# Altium schematic symbol library MCU_Microchip_ATmega.SchLib: 440 symbols (part 3 of 7) (continued)
## ATmega329PA-A (continued)

## ATmega329PA-M
designator *  value ATmega329PA-M  Reference: U
ki_keywords: AVR 8bit Microcontroller MegaAVR LCD PicoPower; ki_description: 20MHz, 32kB Flash, 2kB SRAM, 1kB EEPROM, QFN-64; ki_fp_filters: QFN*1EP*9x9mm*P0.5mm*; Footprint: Package_DFN_QFN:QFN-64-1EP_9x9mm_P0.5mm_EP5.4x5.4mm; Datasheet: http://ww1.microchip.com/downloads/en/DeviceDoc/atmel-8284-8-bit-avr-microcontroller-atmega169a_pa_329a_pa_3290a_pa_649a_p_6490a_p_datasheet.pdf
pins: 1 LCDCAP, 2 PE0, 3 PE1, 4 PE2, 5 PE3, 6 PE4, 7 PE5, 8 PE6, 9 PE7, 10 PB0, 11 PB1, 12 PB2, 13 PB3, 14 PB4, 15 PB5, 16 PB6, 17 PB7, 18 PG3, 19 PG4, 20 PG5/~{{RESET}}, 21 VCC, 22 GND, 23 XTAL2, 24 XTAL1, 25 PD0, 26 PD1, 27 PD2, 28 PD3, 29 PD4, 30 PD5, 31 PD6, 32 PD7, 33 PG0, 34 PG1, 35 PC0, 36 PC1, 37 PC2, 38 PC3, 39 PC4, 40 PC5, 41 PC6, 42 PC7, 43 PG2, 44 PA7, 45 PA6, 46 PA5, 47 PA4, 48 PA3, 49 PA2, 50 PA1, 51 PA0, 52 VCC hidden, 53 GND hidden, 54 PF7, 55 PF6, 56 PF5, 57 PF4, 58 PF3, 59 PF2, 60 PF1, 61 PF0, 62 AREF, 63 GND hidden, 64 AVCC, 65 GND hidden

## ATmega329PV-10A
designator *  value ATmega329PV-10A  Reference: U
ki_keywords: AVR 8bit Microcontroller MegaAVR; ki_description: 10MHz, 32kB Flash, 2kB SRAM, 1kB EEPROM, JTAG, TQFP-64; ki_fp_filters: TQFP*14x14mm*P0.8mm*; Footprint: Package_QFP:TQFP-64_14x14mm_P0.8mm; Datasheet: http://ww1.microchip.com/downloads/en/DeviceDoc/Atmel-8021-AVR-ATmega329P-3290P_Datasheet.pdf
pins: 1 LCDCAP, 2 PE0, 3 PE1, 4 PE2, 5 PE3, 6 PE4, 7 PE5, 8 PE6, 9 PE7, 10 PB0, 11 PB1, 12 PB2, 13 PB3, 14 PB4, 15 PB5, 16 PB6, 17 PB7, 18 PG3, 19 PG4, 20 PG5/~{{RESET}}, 21 VCC, 22 GND, 23 XTAL2, 24 XTAL1, 25 PD0, 26 PD1, 27 PD2, 28 PD3, 29 PD4, 30 PD5, 31 PD6, 32 PD7, 33 PG0, 34 PG1, 35 PC0, 36 PC1, 37 PC2, 38 PC3, 39 PC4, 40 PC5, 41 PC6, 42 PC7, 43 PG2, 44 PA7, 45 PA6, 46 PA5, 47 PA4, 48 PA3, 49 PA2, 50 PA1, 51 PA0, 52 VCC hidden, 53 GND hidden, 54 PF7, 55 PF6, 56 PF5, 57 PF4, 58 PF3, 59 PF2, 60 PF1, 61 PF0, 62 AREF, 63 GND hidden, 64 AVCC

## ATmega329PV-10M
designator *  value ATmega329PV-10M  Reference: U
ki_keywords: AVR 8bit Microcontroller MegaAVR; ki_description: 10MHz, 32kB Flash, 2kB SRAM, 1kB EEPROM, JTAG, QFN-64; ki_fp_filters: QFN*1EP*9x9mm*P0.5mm*; Footprint: Package_DFN_QFN:QFN-64-1EP_9x9mm_P0.5mm_EP5.4x5.4mm; Datasheet: http://ww1.microchip.com/downloads/en/DeviceDoc/Atmel-8021-AVR-ATmega329P-3290P_Datasheet.pdf
pins: 1 LCDCAP, 2 PE0, 3 PE1, 4 PE2, 5 PE3, 6 PE4, 7 PE5, 8 PE6, 9 PE7, 10 PB0, 11 PB1, 12 PB2, 13 PB3, 14 PB4, 15 PB5, 16 PB6, 17 PB7, 18 PG3, 19 PG4, 20 PG5/~{{RESET}}, 21 VCC, 22 GND, 23 XTAL2, 24 XTAL1, 25 PD0, 26 PD1, 27 PD2, 28 PD3, 29 PD4, 30 PD5, 31 PD6, 32 PD7, 33 PG0, 34 PG1, 35 PC0, 36 PC1, 37 PC2, 38 PC3, 39 PC4, 40 PC5, 41 PC6, 42 PC7, 43 PG2, 44 PA7, 45 PA6, 46 PA5, 47 PA4, 48 PA3, 49 PA2, 50 PA1, 51 PA0, 52 VCC hidden, 53 GND hidden, 54 PF7, 55 PF6, 56 PF5, 57 PF4, 58 PF3, 59 PF2, 60 PF1, 61 PF0, 62 AREF, 63 GND hidden, 64 AVCC, 65 GND hidden

## ATmega329V-8A
designator *  value ATmega329V-8A  Reference: U
ki_keywords: AVR 8bit Microcontroller MegaAVR; ki_description: 8MHz, 32kB Flash, 2kB SRAM, 1kB EEPROM, JTAG, TQFP-64; ki_fp_filters: TQFP*14x14mm*P0.8mm*; Footprint: Package_QFP:TQFP-64_14x14mm_P0.8mm; Datasheet: http://ww1.microchip.com/downloads/en/DeviceDoc/doc2552.pdf
pins: 1 LCDCAP, 2 PE0, 3 PE1, 4 PE2, 5 PE3, 6 PE4, 7 PE5, 8 PE6, 9 PE7, 10 PB0, 11 PB1, 12 PB2, 13 PB3, 14 PB4, 15 PB5, 16 PB6, 17 PB7, 18 PG3, 19 PG4, 20 PG5/~{{RESET}}, 21 VCC, 22 GND, 23 XTAL2, 24 XTAL1, 25 PD0, 26 PD1, 27 PD2, 28 PD3, 29 PD4, 30 PD5, 31 PD6, 32 PD7, 33 PG0, 34 PG1, 35 PC0, 36 PC1, 37 PC2, 38 PC3, 39 PC4, 40 PC5, 41 PC6, 42 PC7, 43 PG2, 44 PA7, 45 PA6, 46 PA5, 47 PA4, 48 PA3, 49 PA2, 50 PA1, 51 PA0, 52 VCC hidden, 53 GND hidden, 54 PF7, 55 PF6, 56 PF5, 57 PF4, 58 PF3, 59 PF2, 60 PF1, 61 PF0, 62 AREF, 63 GND hidden, 64 AVCC

## ATmega329V-8M
designator *  value ATmega329V-8M  Reference: U
ki_keywords: AVR 8bit Microcontroller MegaAVR; ki_description: 8MHz, 32kB Flash, 2kB SRAM, 1kB EEPROM, JTAG, QFN-64; ki_fp_filters: QFN*1EP*9x9mm*P0.5mm*; Footprint: Package_DFN_QFN:QFN-64-1EP_9x9mm_P0.5mm_EP5.4x5.4mm; Datasheet: http://ww1.microchip.com/downloads/en/DeviceDoc/doc2552.pdf
pins: 1 LCDCAP, 2 PE0, 3 PE1, 4 PE2, 5 PE3, 6 PE4, 7 PE5, 8 PE6, 9 PE7, 10 PB0, 11 PB1, 12 PB2, 13 PB3, 14 PB4, 15 PB5, 16 PB6, 17 PB7, 18 PG3, 19 PG4, 20 PG5/~{{RESET}}, 21 VCC, 22 GND, 23 XTAL2, 24 XTAL1, 25 PD0, 26 PD1, 27 PD2, 28 PD3, 29 PD4, 30 PD5, 31 PD6, 32 PD7, 33 PG0, 34 PG1, 35 PC0, 36 PC1, 37 PC2, 38 PC3, 39 PC4, 40 PC5, 41 PC6, 42 PC7, 43 PG2, 44 PA7, 45 PA6, 46 PA5, 47 PA4, 48 PA3, 49 PA2, 50 PA1, 51 PA0, 52 VCC hidden, 53 GND hidden, 54 PF7, 55 PF6, 56 PF5, 57 PF4, 58 PF3, 59 PF2, 60 PF1, 61 PF0, 62 AREF, 63 GND hidden, 64 AVCC, 65 GND hidden

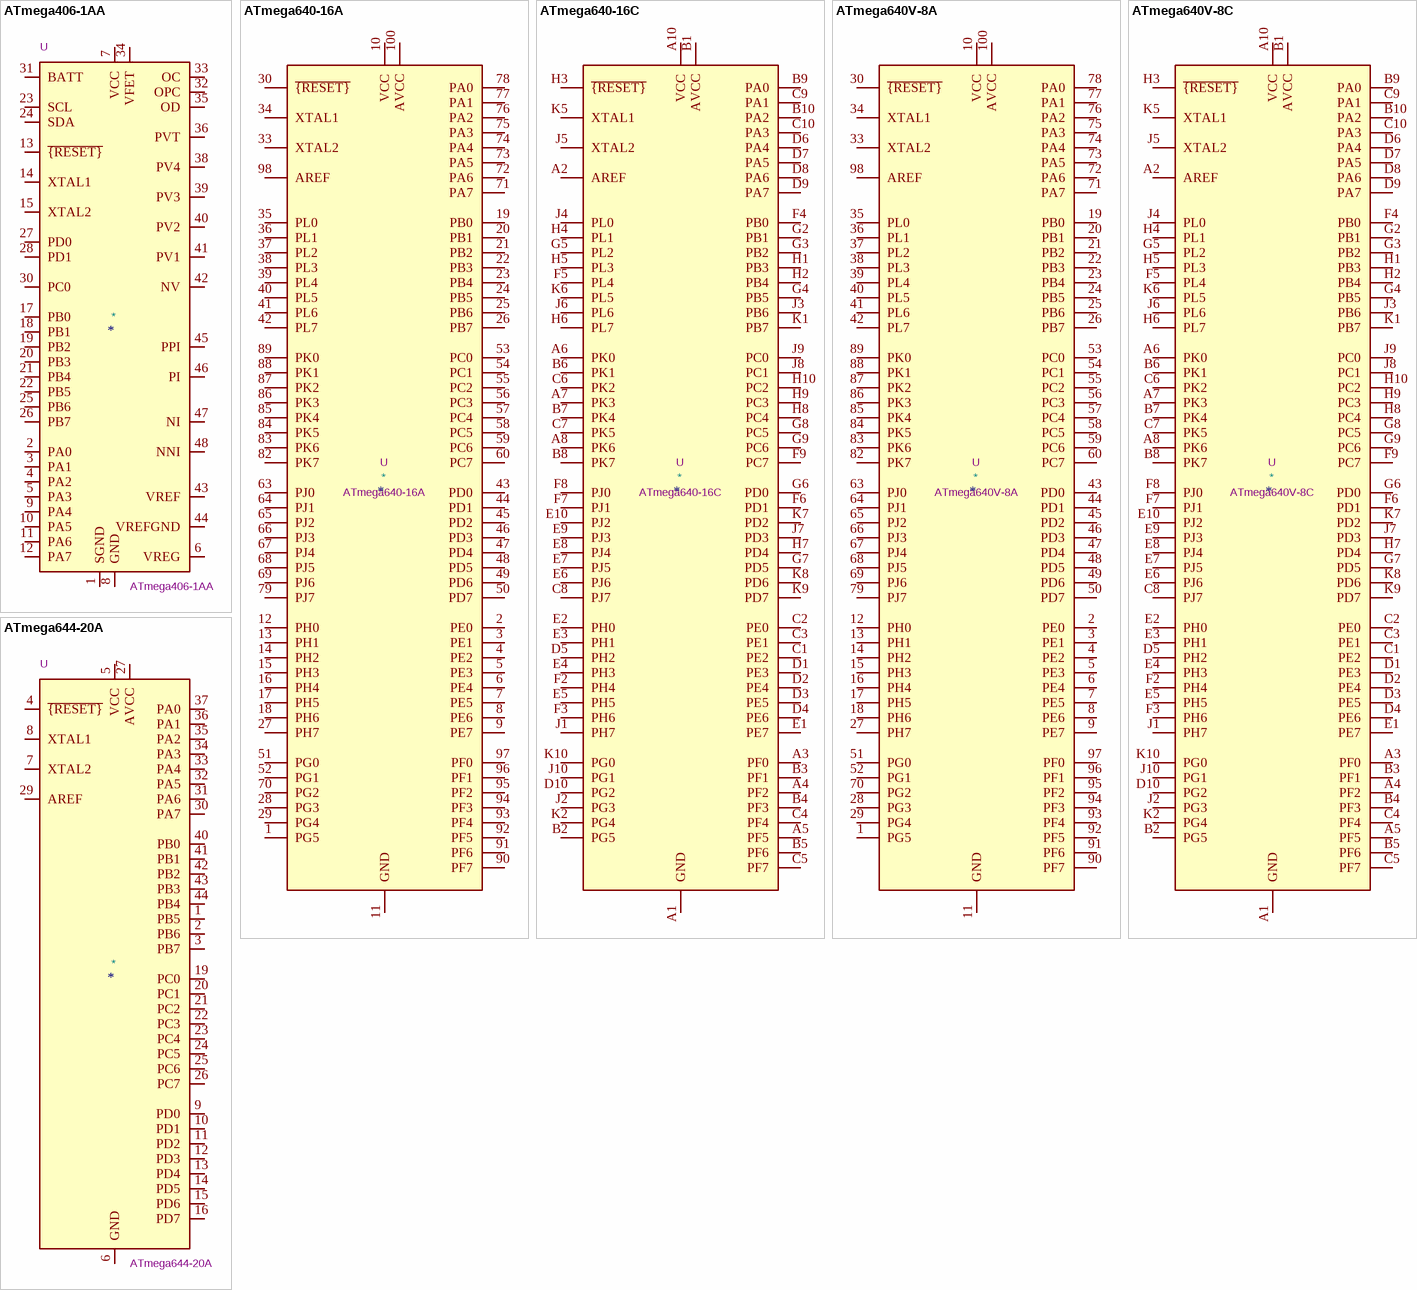
[diagram p18: symbols ATmega406-1AA to ATmega644-20A]

## ATmega406-1AA
designator *  value ATmega406-1AA  Reference: U
ki_keywords: AVR 8bit Microcontroller MegaAVR battery management; ki_description: 1MHz, 40kB Flash, 2kB SRAM, 512B EEPROM, JTAG, LQFP-48; ki_fp_filters: LQFP*7x7mm*P0.5mm*; Footprint: Package_QFP:LQFP-48_7x7mm_P0.5mm; Datasheet: http://ww1.microchip.com/downloads/en/DeviceDoc/Atmel-2548-8-bit-AVR-Microcontroller-Battery-Management-ATmega406_Datasheet.pdf
pins: 1 SGND, 2 PA0, 3 PA1, 4 PA2, 5 PA3, 6 VREG, 7 VCC, 8 GND, 9 PA4, 10 PA5, 11 PA6, 12 PA7, 13 ~{{RESET}}, 14 XTAL1, 15 XTAL2, 16 GND hidden, 17 PB0, 18 PB1, 19 PB2, 20 PB3, 21 PB4, 22 PB5, 23 SCL, 24 SDA, 25 PB6, 26 PB7, 27 PD0, 28 PD1, 29 GND hidden, 30 PC0, 31 BATT, 32 OPC, 33 OC, 34 VFET, 35 OD, 36 PVT, 37 GND hidden, 38 PV4, 39 PV3, 40 PV2, 41 PV1, 42 NV, 43 VREF, 44 VREFGND, 45 PPI, 46 PI, 47 NI, 48 NNI

## ATmega640-16A
designator *  value ATmega640-16A  Reference: U
ki_keywords: AVR 8bit Microcontroller MegaAVR; ki_description: 16MHz, 64kB Flash, 8kB SRAM, 4kB EEPROM, JTAG, TQFP-100; ki_fp_filters: TQFP*14x14mm*P0.5mm*; Footprint: Package_QFP:TQFP-100_14x14mm_P0.5mm; Datasheet: http://ww1.microchip.com/downloads/en/DeviceDoc/Atmel-2549-8-bit-AVR-Microcontroller-ATmega640-1280-1281-2560-2561_datasheet.pdf
pins: 1 PG5, 2 PE0, 3 PE1, 4 PE2, 5 PE3, 6 PE4, 7 PE5, 8 PE6, 9 PE7, 10 VCC, 11 GND, 12 PH0, 13 PH1, 14 PH2, 15 PH3, 16 PH4, 17 PH5, 18 PH6, 19 PB0, 20 PB1, 21 PB2, 22 PB3, 23 PB4, 24 PB5, 25 PB6, 26 PB7, 27 PH7, 28 PG3, 29 PG4, 30 ~{{RESET}}, 31 VCC hidden, 32 GND hidden, 33 XTAL2, 34 XTAL1, 35 PL0, 36 PL1, 37 PL2, 38 PL3, 39 PL4, 40 PL5, 41 PL6, 42 PL7, 43 PD0, 44 PD1, 45 PD2, 46 PD3, 47 PD4, 48 PD5, 49 PD6, 50 PD7, 51 PG0, 52 PG1, 53 PC0, 54 PC1, 55 PC2, 56 PC3, 57 PC4, 58 PC5, 59 PC6, 60 PC7, 61 VCC hidden, 62 GND hidden, 63 PJ0, 64 PJ1, 65 PJ2, 66 PJ3, 67 PJ4, 68 PJ5, 69 PJ6, 70 PG2, 71 PA7, 72 PA6, 73 PA5, 74 PA4, 75 PA3, 76 PA2, 77 PA1, 78 PA0, 79 PJ7, 80 VCC hidden, 81 GND hidden, 82 PK7, 83 PK6, 84 PK5, 85 PK4, 86 PK3, 87 PK2, 88 PK1, 89 PK0, 90 PF7, 91 PF6, 92 PF5, 93 PF4, 94 PF3, 95 PF2, 96 PF1, 97 PF0, 98 AREF, 99 GND hidden, 100 AVCC

## ATmega640-16C
designator *  value ATmega640-16C  Reference: U
ki_keywords: AVR 8bit Microcontroller MegaAVR; ki_description: 16MHz, 64kB Flash, 8kB SRAM, 4kB EEPROM, JTAG, TFBGA-100; ki_fp_filters: TFBGA*9.0x9.0mm*Layout10x10*P0.8mm*; Footprint: Package_BGA:TFBGA-100_9.0x9.0mm_Layout10x10_P0.8mm; Datasheet: http://ww1.microchip.com/downloads/en/DeviceDoc/Atmel-2549-8-bit-AVR-Microcontroller-ATmega640-1280-1281-2560-2561_datasheet.pdf
pins: A1 GND, A2 AREF, A3 PF0, A4 PF2, A5 PF5, A6 PK0, A7 PK3, A8 PK6, A9 GND hidden, A10 VCC, B1 AVCC, B2 PG5, B3 PF1, B4 PF3, B5 PF6, B6 PK1, B7 PK4, B8 PK7, B9 PA0, B10 PA2, C1 PE2, C2 PE0, C3 PE1, C4 PF4, C5 PF7, C6 PK2, C7 PK5, C8 PJ7, C9 PA1, C10 PA3, D1 PE3, D2 PE4, D3 PE5, D4 PE6, D5 PH2, D6 PA4, D7 PA5, D8 PA6, D9 PA7, D10 PG2, E1 PE7, E2 PH0, E3 PH1, E4 PH3, E5 PH5, E6 PJ6, E7 PJ5, E8 PJ4, E9 PJ3, E10 PJ2, F1 VCC hidden, F2 PH4, F3 PH6, F4 PB0, F5 PL4, F6 PD1, F7 PJ1, F8 PJ0, F9 PC7, F10 GND hidden, G1 GND hidden, G2 PB1, G3 PB2, G4 PB5, G5 PL2, G6 PD0, G7 PD5, G8 PC5, G9 PC6, G10 VCC hidden, H1 PB3, H2 PB4, H3 ~{{RESET}}, H4 PL1, H5 PL3, H6 PL7, H7 PD4, H8 PC4, H9 PC3, H10 PC2, J1 PH7, J2 PG3, J3 PB6, J4 PL0, J5 XTAL2, J6 PL6, J7 PD3, J8 PC1, J9 PC0, J10 PG1, K1 PB7, K2 PG4, K3 VCC hidden, K4 GND hidden, K5 XTAL1, K6 PL5, K7 PD2, K8 PD6, K9 PD7, K10 PG0

## ATmega640V-8A
designator *  value ATmega640V-8A  Reference: U
ki_keywords: AVR 8bit Microcontroller MegaAVR; ki_description: 8MHz, 64kB Flash, 8kB SRAM, 4kB EEPROM, JTAG, TQFP-100; ki_fp_filters: TQFP*14x14mm*P0.5mm*; Footprint: Package_QFP:TQFP-100_14x14mm_P0.5mm; Datasheet: http://ww1.microchip.com/downloads/en/DeviceDoc/Atmel-2549-8-bit-AVR-Microcontroller-ATmega640-1280-1281-2560-2561_datasheet.pdf
pins: 1 PG5, 2 PE0, 3 PE1, 4 PE2, 5 PE3, 6 PE4, 7 PE5, 8 PE6, 9 PE7, 10 VCC, 11 GND, 12 PH0, 13 PH1, 14 PH2, 15 PH3, 16 PH4, 17 PH5, 18 PH6, 19 PB0, 20 PB1, 21 PB2, 22 PB3, 23 PB4, 24 PB5, 25 PB6, 26 PB7, 27 PH7, 28 PG3, 29 PG4, 30 ~{{RESET}}, 31 VCC hidden, 32 GND hidden, 33 XTAL2, 34 XTAL1, 35 PL0, 36 PL1, 37 PL2, 38 PL3, 39 PL4, 40 PL5, 41 PL6, 42 PL7, 43 PD0, 44 PD1, 45 PD2, 46 PD3, 47 PD4, 48 PD5, 49 PD6, 50 PD7, 51 PG0, 52 PG1, 53 PC0, 54 PC1, 55 PC2, 56 PC3, 57 PC4, 58 PC5, 59 PC6, 60 PC7, 61 VCC hidden, 62 GND hidden, 63 PJ0, 64 PJ1, 65 PJ2, 66 PJ3, 67 PJ4, 68 PJ5, 69 PJ6, 70 PG2, 71 PA7, 72 PA6, 73 PA5, 74 PA4, 75 PA3, 76 PA2, 77 PA1, 78 PA0, 79 PJ7, 80 VCC hidden, 81 GND hidden, 82 PK7, 83 PK6, 84 PK5, 85 PK4, 86 PK3, 87 PK2, 88 PK1, 89 PK0, 90 PF7, 91 PF6, 92 PF5, 93 PF4, 94 PF3, 95 PF2, 96 PF1, 97 PF0, 98 AREF, 99 GND hidden, 100 AVCC

## ATmega640V-8C
designator *  value ATmega640V-8C  Reference: U
ki_keywords: AVR 8bit Microcontroller MegaAVR; ki_description: 8MHz, 64kB Flash, 8kB SRAM, 4kB EEPROM, JTAG, TFBGA-100; ki_fp_filters: TFBGA*9.0x9.0mm*Layout10x10*P0.8mm*; Footprint: Package_BGA:TFBGA-100_9.0x9.0mm_Layout10x10_P0.8mm; Datasheet: http://ww1.microchip.com/downloads/en/DeviceDoc/Atmel-2549-8-bit-AVR-Microcontroller-ATmega640-1280-1281-2560-2561_datasheet.pdf
pins: A1 GND, A2 AREF, A3 PF0, A4 PF2, A5 PF5, A6 PK0, A7 PK3, A8 PK6, A9 GND hidden, A10 VCC, B1 AVCC, B2 PG5, B3 PF1, B4 PF3, B5 PF6, B6 PK1, B7 PK4, B8 PK7, B9 PA0, B10 PA2, C1 PE2, C2 PE0, C3 PE1, C4 PF4, C5 PF7, C6 PK2, C7 PK5, C8 PJ7, C9 PA1, C10 PA3, D1 PE3, D2 PE4, D3 PE5, D4 PE6, D5 PH2, D6 PA4, D7 PA5, D8 PA6, D9 PA7, D10 PG2, E1 PE7, E2 PH0, E3 PH1, E4 PH3, E5 PH5, E6 PJ6, E7 PJ5, E8 PJ4, E9 PJ3, E10 PJ2, F1 VCC hidden, F2 PH4, F3 PH6, F4 PB0, F5 PL4, F6 PD1, F7 PJ1, F8 PJ0, F9 PC7, F10 GND hidden, G1 GND hidden, G2 PB1, G3 PB2, G4 PB5, G5 PL2, G6 PD0, G7 PD5, G8 PC5, G9 PC6, G10 VCC hidden, H1 PB3, H2 PB4, H3 ~{{RESET}}, H4 PL1, H5 PL3, H6 PL7, H7 PD4, H8 PC4, H9 PC3, H10 PC2, J1 PH7, J2 PG3, J3 PB6, J4 PL0, J5 XTAL2, J6 PL6, J7 PD3, J8 PC1, J9 PC0, J10 PG1, K1 PB7, K2 PG4, K3 VCC hidden, K4 GND hidden, K5 XTAL1, K6 PL5, K7 PD2, K8 PD6, K9 PD7, K10 PG0

## ATmega644-20A
designator *  value ATmega644-20A  Reference: U
ki_keywords: AVR 8bit Microcontroller MegaAVR; ki_description: 20MHz, 64kB Flash, 4kB SRAM, 2kB EEPROM, JTAG, TQFP-44; ki_fp_filters: TQFP*10x10mm*P0.8mm*; Footprint: Package_QFP:TQFP-44_10x10mm_P0.8mm; Datasheet: http://ww1.microchip.com/downloads/en/DeviceDoc/doc2593.pdf
pins: 1 PB5, 2 PB6, 3 PB7, 4 ~{{RESET}}, 5 VCC, 6 GND, 7 XTAL2, 8 XTAL1, 9 PD0, 10 PD1, 11 PD2, 12 PD3, 13 PD4, 14 PD5, 15 PD6, 16 PD7, 17 VCC hidden, 18 GND hidden, 19 PC0, 20 PC1, 21 PC2, 22 PC3, 23 PC4, 24 PC5, 25 PC6, 26 PC7, 27 AVCC, 28 GND hidden, 29 AREF, 30 PA7, 31 PA6, 32 PA5, 33 PA4, 34 PA3, 35 PA2, 36 PA1, 37 PA0, 38 VCC hidden, 39 GND hidden, 40 PB0, 41 PB1, 42 PB2, 43 PB3, 44 PB4

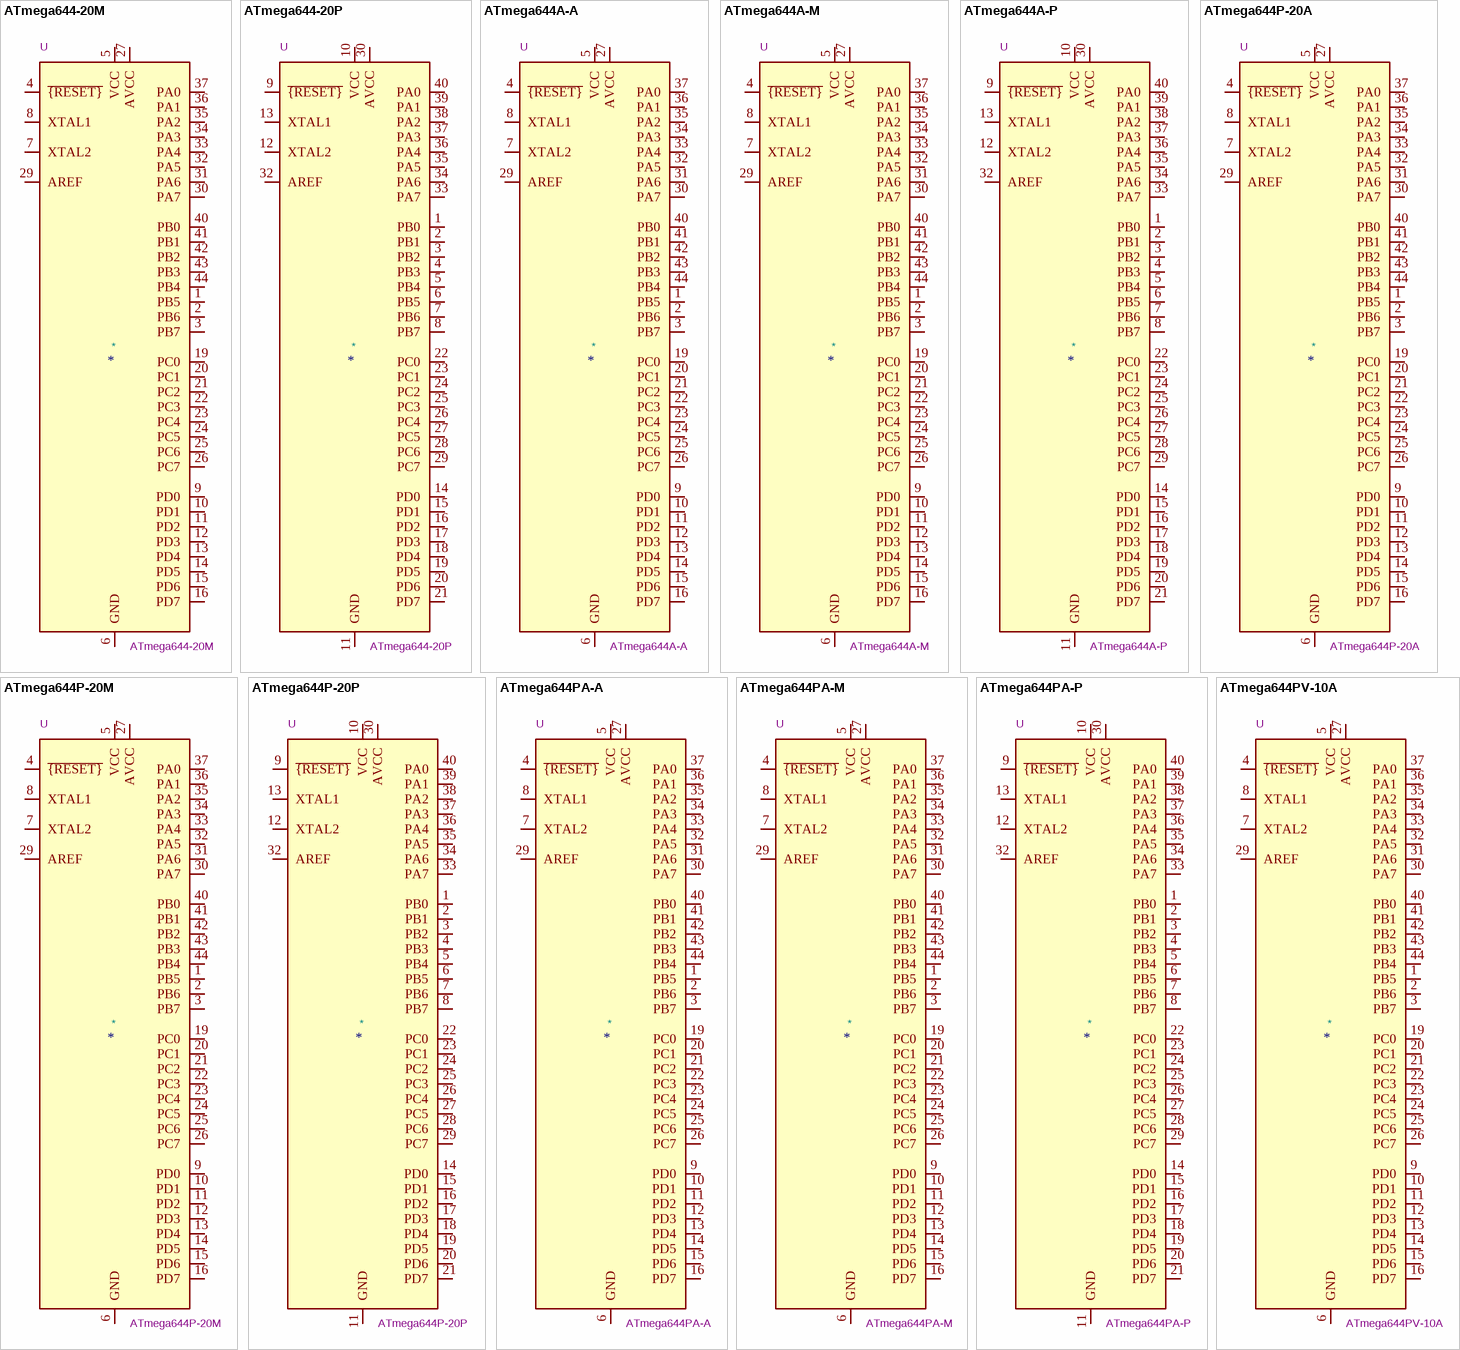
[diagram p19: symbols ATmega644-20M to ATmega644PV-10A]

## ATmega644-20M
designator *  value ATmega644-20M  Reference: U
ki_keywords: AVR 8bit Microcontroller MegaAVR; ki_description: 20MHz, 64kB Flash, 4kB SRAM, 2kB EEPROM, JTAG, QFN-44; ki_fp_filters: QFN*1EP*7x7mm*P0.5mm*; Footprint: Package_DFN_QFN:QFN-44-1EP_7x7mm_P0.5mm_EP5.2x5.2mm; Datasheet: http://ww1.microchip.com/downloads/en/DeviceDoc/doc2593.pdf
pins: 1 PB5, 2 PB6, 3 PB7, 4 ~{{RESET}}, 5 VCC, 6 GND, 7 XTAL2, 8 XTAL1, 9 PD0, 10 PD1, 11 PD2, 12 PD3, 13 PD4, 14 PD5, 15 PD6, 16 PD7, 17 VCC hidden, 18 GND hidden, 19 PC0, 20 PC1, 21 PC2, 22 PC3, 23 PC4, 24 PC5, 25 PC6, 26 PC7, 27 AVCC, 28 GND hidden, 29 AREF, 30 PA7, 31 PA6, 32 PA5, 33 PA4, 34 PA3, 35 PA2, 36 PA1, 37 PA0, 38 VCC hidden, 39 GND hidden, 40 PB0, 41 PB1, 42 PB2, 43 PB3, 44 PB4, 45 GND hidden

## ATmega644-20P
designator *  value ATmega644-20P  Reference: U
ki_keywords: AVR 8bit Microcontroller MegaAVR; ki_description: 20MHz, 64kB Flash, 4kB SRAM, 2kB EEPROM, JTAG, DIP-40; ki_fp_filters: DIP*W15.24mm*; Footprint: Package_DIP:DIP-40_W15.24mm; Datasheet: http://ww1.microchip.com/downloads/en/DeviceDoc/doc2593.pdf
pins: 1 PB0, 2 PB1, 3 PB2, 4 PB3, 5 PB4, 6 PB5, 7 PB6, 8 PB7, 9 ~{{RESET}}, 10 VCC, 11 GND, 12 XTAL2, 13 XTAL1, 14 PD0, 15 PD1, 16 PD2, 17 PD3, 18 PD4, 19 PD5, 20 PD6, 21 PD7, 22 PC0, 23 PC1, 24 PC2, 25 PC3, 26 PC4, 27 PC5, 28 PC6, 29 PC7, 30 AVCC, 31 GND hidden, 32 AREF, 33 PA7, 34 PA6, 35 PA5, 36 PA4, 37 PA3, 38 PA2, 39 PA1, 40 PA0

## ATmega644A-A
designator *  value ATmega644A-A  Reference: U
ki_keywords: AVR 8bit Microcontroller MegaAVR; ki_description: 20MHz, 64kB Flash, 4kB SRAM, 2kB EEPROM, JTAG, TQFP-44; ki_fp_filters: TQFP*10x10mm*P0.8mm*; Footprint: Package_QFP:TQFP-44_10x10mm_P0.8mm; Datasheet: http://ww1.microchip.com/downloads/en/DeviceDoc/Atmel-8272-8-bit-AVR-microcontroller-ATmega164A_PA-324A_PA-644A_PA-1284_P_datasheet.pdf
pins: 1 PB5, 2 PB6, 3 PB7, 4 ~{{RESET}}, 5 VCC, 6 GND, 7 XTAL2, 8 XTAL1, 9 PD0, 10 PD1, 11 PD2, 12 PD3, 13 PD4, 14 PD5, 15 PD6, 16 PD7, 17 VCC hidden, 18 GND hidden, 19 PC0, 20 PC1, 21 PC2, 22 PC3, 23 PC4, 24 PC5, 25 PC6, 26 PC7, 27 AVCC, 28 GND hidden, 29 AREF, 30 PA7, 31 PA6, 32 PA5, 33 PA4, 34 PA3, 35 PA2, 36 PA1, 37 PA0, 38 VCC hidden, 39 GND hidden, 40 PB0, 41 PB1, 42 PB2, 43 PB3, 44 PB4

## ATmega644A-M
designator *  value ATmega644A-M  Reference: U
ki_keywords: AVR 8bit Microcontroller MegaAVR; ki_description: 20MHz, 64kB Flash, 4kB SRAM, 2kB EEPROM, JTAG, QFN-44; ki_fp_filters: QFN*1EP*7x7mm*P0.5mm*; Footprint: Package_DFN_QFN:QFN-44-1EP_7x7mm_P0.5mm_EP5.2x5.2mm; Datasheet: http://ww1.microchip.com/downloads/en/DeviceDoc/Atmel-8272-8-bit-AVR-microcontroller-ATmega164A_PA-324A_PA-644A_PA-1284_P_datasheet.pdf
pins: 1 PB5, 2 PB6, 3 PB7, 4 ~{{RESET}}, 5 VCC, 6 GND, 7 XTAL2, 8 XTAL1, 9 PD0, 10 PD1, 11 PD2, 12 PD3, 13 PD4, 14 PD5, 15 PD6, 16 PD7, 17 VCC hidden, 18 GND hidden, 19 PC0, 20 PC1, 21 PC2, 22 PC3, 23 PC4, 24 PC5, 25 PC6, 26 PC7, 27 AVCC, 28 GND hidden, 29 AREF, 30 PA7, 31 PA6, 32 PA5, 33 PA4, 34 PA3, 35 PA2, 36 PA1, 37 PA0, 38 VCC hidden, 39 GND hidden, 40 PB0, 41 PB1, 42 PB2, 43 PB3, 44 PB4, 45 GND hidden

## ATmega644A-P
designator *  value ATmega644A-P  Reference: U
ki_keywords: AVR 8bit Microcontroller MegaAVR; ki_description: 20MHz, 64kB Flash, 4kB SRAM, 2kB EEPROM, JTAG, DIP-40; ki_fp_filters: DIP*W15.24mm*; Footprint: Package_DIP:DIP-40_W15.24mm; Datasheet: http://ww1.microchip.com/downloads/en/DeviceDoc/Atmel-8272-8-bit-AVR-microcontroller-ATmega164A_PA-324A_PA-644A_PA-1284_P_datasheet.pdf
pins: 1 PB0, 2 PB1, 3 PB2, 4 PB3, 5 PB4, 6 PB5, 7 PB6, 8 PB7, 9 ~{{RESET}}, 10 VCC, 11 GND, 12 XTAL2, 13 XTAL1, 14 PD0, 15 PD1, 16 PD2, 17 PD3, 18 PD4, 19 PD5, 20 PD6, 21 PD7, 22 PC0, 23 PC1, 24 PC2, 25 PC3, 26 PC4, 27 PC5, 28 PC6, 29 PC7, 30 AVCC, 31 GND hidden, 32 AREF, 33 PA7, 34 PA6, 35 PA5, 36 PA4, 37 PA3, 38 PA2, 39 PA1, 40 PA0